# Altium footprint library UP-ROBOT Devices(2013-02-26).PcbLib: 150 footprints (part 8 of 10)
Each footprint in its own frame and in the unit in brackets; x right, y up, seen from the top. Pads: shape width x height; smd on the part's side, far side on the other; paste and mask are expansions set on the pad; w line width, h text height; cw(c..) or ccw(c..) is an arc to the next point about the centre after c.
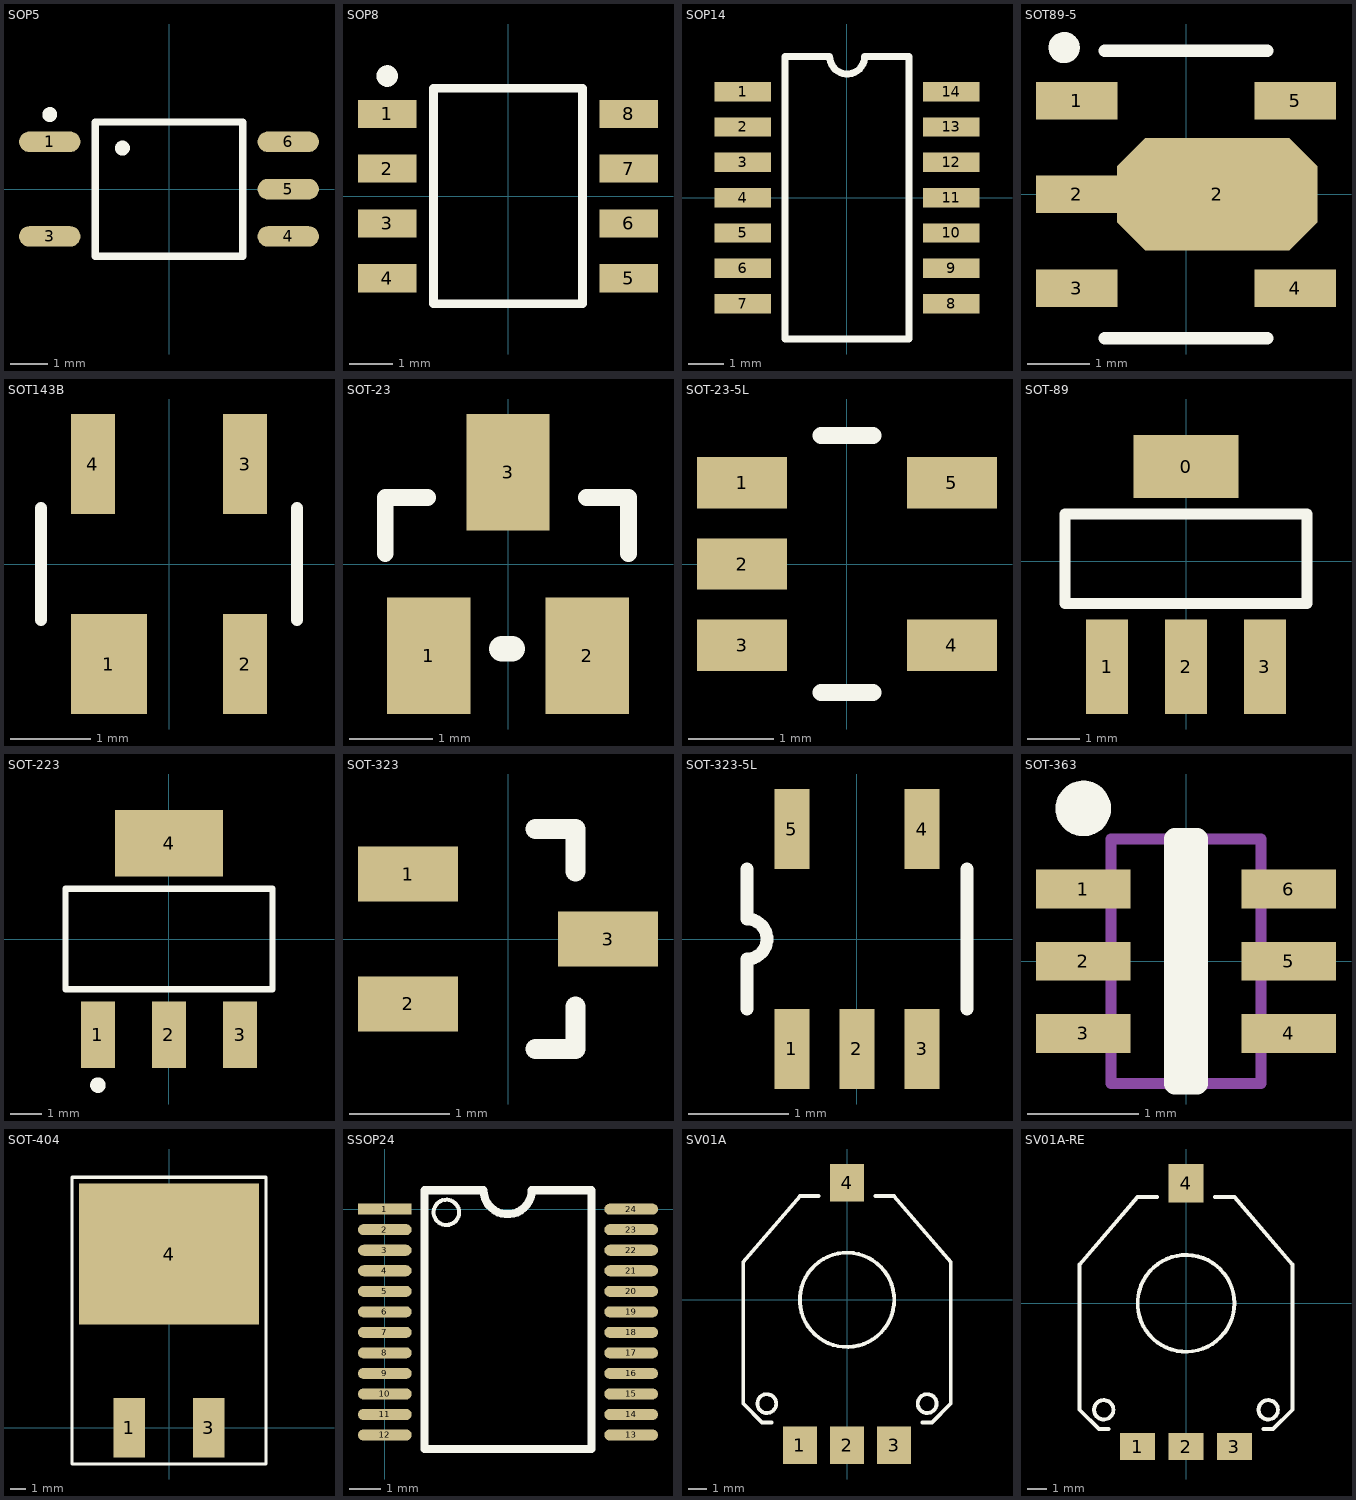
[diagram p7: the footprints below, top view; thin cyan lines are the x and y axes]

## SOP5 [mm]
height 2.5
pads (5):
  oval 1.65x0.55 smd: 1(-3.2,1.27) 3(-3.2,-1.27) 4(3.2,-1.27) 5(3.2,0) 6(3.2,1.27)
Top Overlay:
  circle w0.2: c-1.25,1.1 r0.1
  circle w0.2: c-3.2,2 r0.1
  lines w0.2: -1.975,-1.8 1.975,-1.8 1.975,1.8 -1.975,1.8 -1.975,-1.8
3D body: height 2.6, standoff 0, extent -3.5,-1.8 3.5,1.8

## SOP8 [mm]
height 1.8
pads (8):
  rect 1.35x0.65 smd: 1(-2.8,1.905) 2(-2.8,0.635) 3(-2.8,-0.635) 4(-2.8,-1.905) 5(2.8,-1.905) 6(2.8,-0.635) 7(2.8,0.635) 8(2.8,1.905)
Top Overlay:
  circle w0.25: c-2.8,2.78 r0.125
  lines w0.2: -1.725,-2.5 -1.725,2.5 1.725,2.5 1.725,-2.5 -1.725,-2.5
3D body: height 1.74, standoff -0.01, extent -3.1,-2.53 3.1,2.47

## SOP14 [mm] "SOP, 14-Leads, Body 8.0x4.4mm (max), Pitch 1.00mm, IPC Medium Density"
height 1.8
pads (14):
  rect 1.6x0.55 smd: 1(-2.95,3) 2(-2.95,2) 3(-2.95,1) 4(-2.95,0) 5(-2.95,-1) 6(-2.95,-2) 7(-2.95,-3) 8(2.95,-3) 9(2.95,-2) 10(2.95,-1) 11(2.95,0) 12(2.95,1) 13(2.95,2) 14(2.95,3)
Top Overlay:
  lines w0.2: -0.5,4 -1.75,4 -1.75,-4 1.75,-4 1.75,4 0.5,4 cw(c0.005,3.995) -0.49,4

## SOT89-5 [mm]
pads (6):
  rect 1.3x0.6 smd: 1(-1.75,1.5) 2(-1.75,0) 3(-1.75,-1.5) 4(1.75,-1.5) 5(1.75,1.5)
  oct 3.2x1.8 smd: 2(0.5,0)
Top Overlay:
  circle w0.25: c-1.95,2.35 r0.125
  lines w0.2: -1.3,-2.3 1.3,-2.3 ; -1.3,2.3 1.3,2.3

## SOT143B [mm]
pads (4):
  rect 0.95x1.25 smd: 1(-0.75,-1.25)
  rect 0.55x1.25 smd: 2(0.95,-1.25) 3(0.95,1.25) 4(-0.95,1.25)
Top Overlay:
  lines w0.152: -1.6,-0.7 -1.6,0.7 ; 1.6,-0.7 1.6,0.7
3D body: height 1.09, standoff 0, extent -1.394,-1.213 1.4,1.213

## SOT-23 [mm]
pads (3):
  rect 1x1.4 smd: 1(-0.95,-1.1) 2(0.95,-1.1) 3(0,1.1)
Top Overlay:
  lines w0.203: -1.473,0.127 -1.473,0.8 -0.965,0.8 ; 0.94,0.8 1.448,0.8 1.448,0.127
  lines w0.305: -0.076,-1.016 0.051,-1.016
3D body: height 1.09, standoff 0, extent -1.394,-1.213 1.4,1.213

## SOT-23-5L [mm] "SOT23, 5-Leads, Body 3.0x3.0mm (max), Pitch 0.95mm, IPC Medium Density"
height 1.22
pads (5):
  rect 1.05x0.6 smd: 1(-1.225,0.95) 2(-1.225,0) 3(-1.225,-0.95) 4(1.225,-0.95) 5(1.225,0.95)
Top Overlay:
  lines w0.2: -0.3,-1.5 0.3,-1.5 ; -0.3,1.5 0.3,1.5
3D body: height 1.2, standoff -0.02, extent -1.5,-1.5 1.5,1.5

## SOT-89 [mm]
pads (4):
  rect 2x1.2 smd: 0(0,1.8)
  rect 0.8x1.8 smd: 1(-1.5,-2) 2(0,-2) 3(1.5,-2)
Top Overlay:
  lines w0.203: -2.3,-0.8 2.3,-0.8 2.3,0.9 0.4,0.9 -2.3,0.9 -2.3,-0.8
3D body: height 1.59, standoff -0.01, extent -2.314,-2.358 2.286,1.893

## SOT-223 [mm]
pads (4):
  rect 1.1x2.15 smd: 1(-2.3,-3.1) 2(0,-3.1) 3(2.3,-3.1)
  rect 3.5x2.15 smd: 4(0,3.1)
Top Overlay:
  circle w0.25: c-2.3,-4.725 r0.125
  lines w0.2: -3.35,-1.625 3.35,-1.625 3.35,1.625 -3.35,1.625 -3.35,-1.625
3D body: height 1.8, standoff 0, extent -3.15,-3.3 3.15,3.3

## SOT-323 [mm] "SOT23, 3-Leads, Body 2.2x2.2mm (max), Pitch 0.65mm, IPC Medium Density"
height 0.95
pads (3):
  rect 1x0.55 smd: 1(-1,0.65) 2(-1,-0.65) 3(1,0)
Top Overlay:
  lines w0.2: 0.275,-1.1 0.675,-1.1 0.675,-0.675 ; 0.275,1.1 0.675,1.1 0.675,0.675
3D body: height 1.05, standoff -0.05, extent -1.055,-1.1 1.095,1.1

## SOT-323-5L [mm]
pads (5):
  rect 0.35x0.8 smd: 1(-0.65,-1.1) 2(0,-1.1) 3(0.65,-1.1) 4(0.65,1.1) 5(-0.65,1.1)
Top Overlay:
  lines w0.127: -1.1,-0.7 -1.1,-0.2 ccw(c-1.1,0) -1.1,0.2 -1.1,0.7 ; 1.1,-0.7 1.1,0.7
3D body: height 1, standoff 0, extent -1,-0.975 1,1.025

## SOT-363 [mm]
height 1.1
pads (6):
  rect 0.85x0.35 smd: 1(-0.925,0.65) 2(-0.925,0) 3(-0.925,-0.65) 4(0.925,-0.65) 5(0.925,0) 6(0.925,0.65)
Top Overlay:
  circle w0.25: c-0.925,1.375 r0.125
  lines w0.2: -0.1,-1.1 0.1,-1.1 0.1,1.1 -0.1,1.1 -0.1,-1.1
Mechanical 13:
  lines w0.1: -0.675,-1.1 -0.675,1.1 0.675,1.1 0.675,-1.1 -0.675,-1.1
3D body: height 1.1, standoff 0, extent -1.2,-1.1 1.2,1.1

## SOT-404 [mm]
pads (3):
  rect 2x3.8 smd: 1(-2.54,0) 3(2.54,0)
  rect 11.5x9 smd: 4(0,11.1)
Top Overlay:
  lines w0.203: -6.2,-2.3 6.2,-2.3 6.2,16 -6.2,16 -6.2,-2.3

## SSOP24 [mm]
pads (24):
  rect 1.7x0.35 smd: 1(0,0)
  oval 1.7x0.35 smd: 2(0,-0.65) 3(0,-1.3) 4(0,-1.95) 5(0,-2.6) 6(0,-3.25) 7(0,-3.9) 8(0,-4.55) 9(0,-5.2) 10(0,-5.85) 11(0,-6.5) 12(0,-7.15) 13(7.8,-7.15) 14(7.8,-6.5) 15(7.8,-5.85) 16(7.8,-5.2) 17(7.8,-4.55) 18(7.8,-3.9) 19(7.8,-3.25) 20(7.8,-2.6) 21(7.8,-1.95) 22(7.8,-1.3) 23(7.8,-0.65) 24(7.8,0)
Top Overlay:
  circle w0.127: c1.948,-0.1 r0.402
  lines w0.254: 1.25,-7.6 1.25,0.6 3.126,0.6 ccw(c3.888,0.6) 4.65,0.6 6.55,0.6 6.55,-7.6 1.25,-7.6
3D body: height 1.97, standoff -0.02, extent -0.038,-7.896 7.862,0.734

## SV01A [mm] "Angle sensor"
height 2.1
pads (4):
  rect 1.8x2 smd: 1(-2.5,-7.7) 2(0,-7.7) 3(2.5,-7.7) 4(0,6.2)
Top Overlay:
  circle w0.2: c4.25,-5.5 r0.5
  circle w0.2: c-4.25,-5.5 r0.5
  circle w0.2: c0,0 r2.5
  lines w0.2: -4,-6.5 -4.5,-6.5 -5.5,-5.5 -5.5,2 -2.5,5.5 -1.5,5.5 ; 1.5,5.5 2.5,5.5 5.5,2 5.5,-5.5 4.5,-6.5 4,-6.5
3D body: height 2.1, standoff -1, extent -5.5,-8.2 5.5,6.7

## SV01A-RE [mm] "Angle sensor"
height 2.1
pads (4):
  rect 1.8x1.4 smd: 1(-2.5,-7.4) 2(0,-7.4) 3(2.5,-7.4)
  rect 1.8x2 smd: 4(0,6.2)
Top Overlay:
  circle w0.2: c4.25,-5.5 r0.5
  circle w0.2: c-4.25,-5.5 r0.5
  circle w0.2: c0,0 r2.5
  lines w0.2: -4,-6.5 -4.5,-6.5 -5.5,-5.5 -5.5,2 -2.5,5.5 -1.5,5.5 ; 1.5,5.5 2.5,5.5 5.5,2 5.5,-5.5 4.5,-6.5 4,-6.5
3D body: height 2.1, standoff -1, extent -5.5,-8.2 5.5,6.7